# Altium footprint library LimeMicroAltiumLib_pcbLib_r01.PcbLib: 434 footprints (part 10 of 29)
Each footprint in its own frame and in the unit in brackets; x right, y up, seen from the top. Pads: shape width x height; smd on the part's side, far side on the other; paste and mask are expansions set on the pad; w line width, h text height; cw(c..) or ccw(c..) is an arc to the next point about the centre after c.
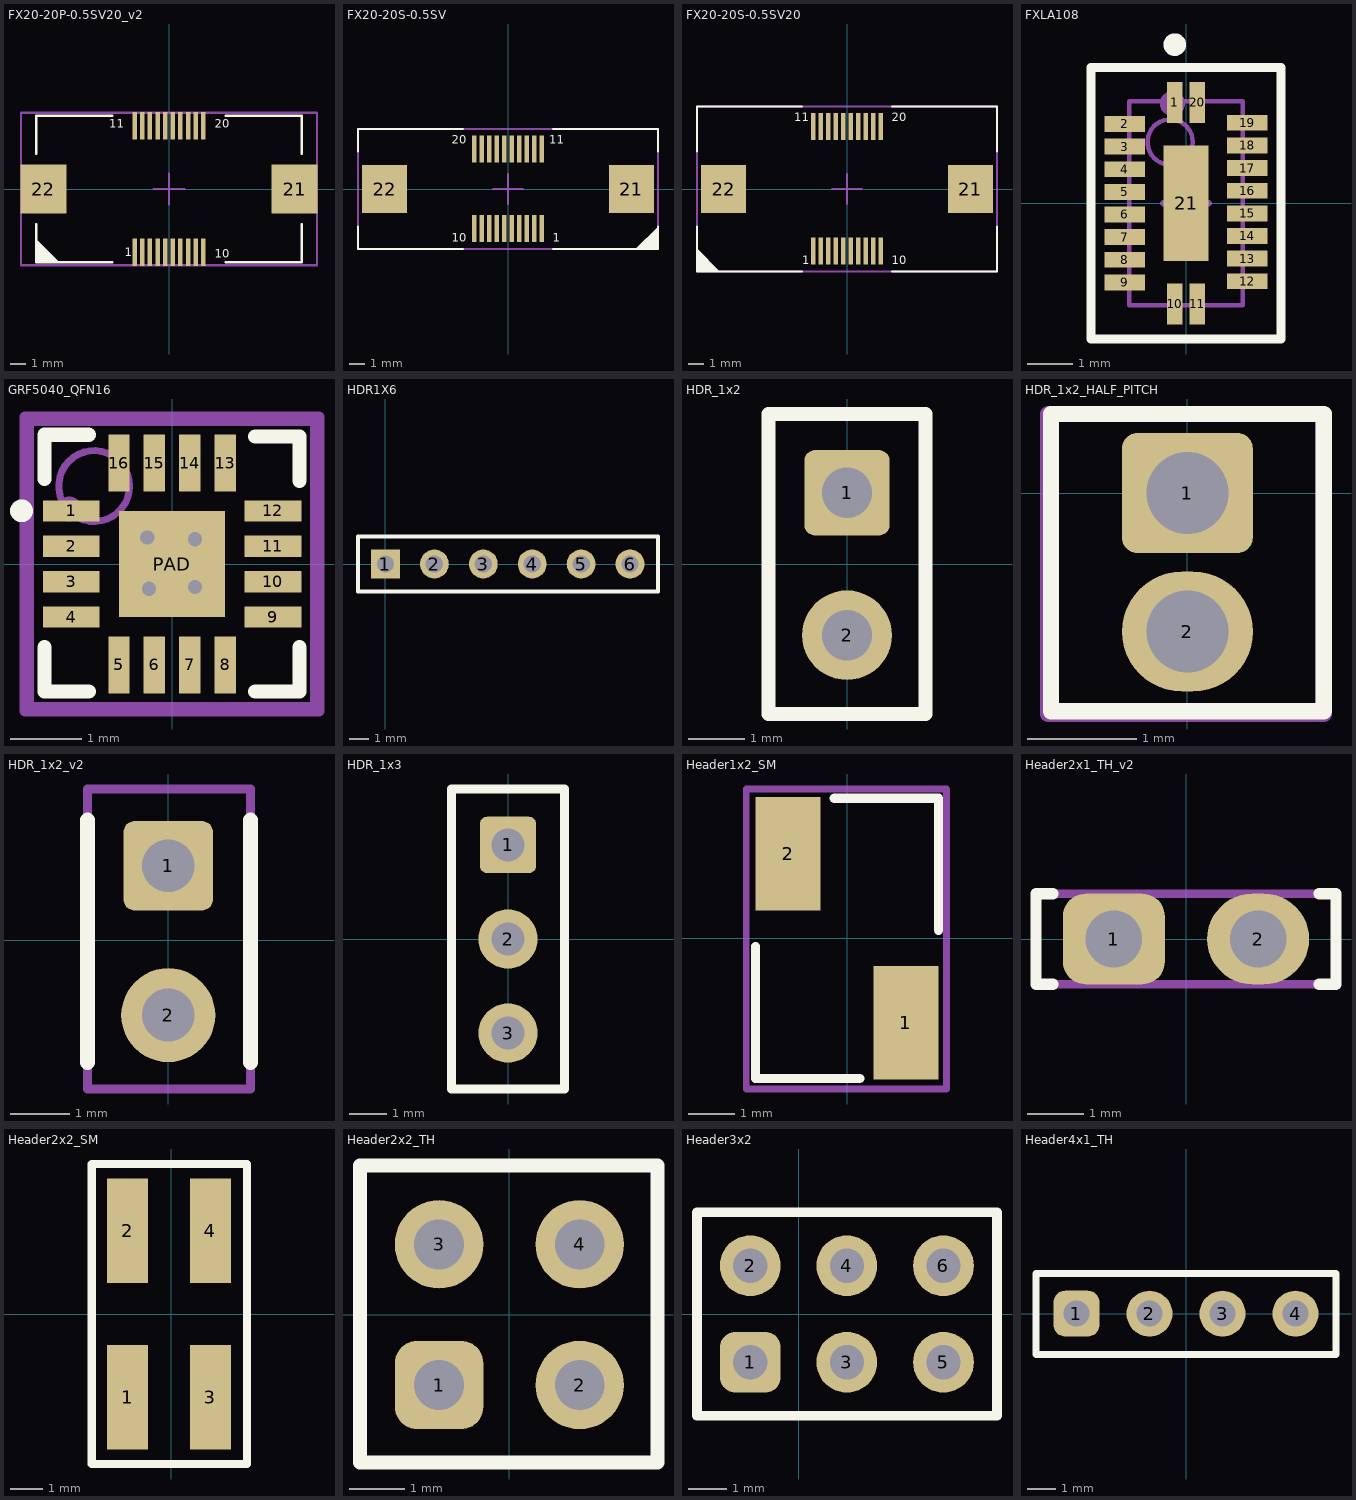
[diagram p9: the footprints below, top view; thin cyan lines are the x and y axes]

## FX20-20P-0.5SV20_v2 [mm]
pads (22):
  rect 0.3x1.8 smd mask+0.05: 1(-2.25,-4.15) 2(-1.75,-4.15) 3(-1.25,-4.15) 4(-0.75,-4.15) 5(-0.25,-4.15) 6(0.25,-4.15) 7(0.75,-4.15) 8(1.25,-4.15) 9(1.75,-4.15) 10(2.25,-4.15) 11(-2.25,4.15) 12(-1.75,4.15) 13(-1.25,4.15) 14(-0.75,4.15) 15(-0.25,4.15) 16(0.25,4.15) 17(0.75,4.15) 18(1.25,4.15) 19(1.75,4.15) 20(2.25,4.15)
  rect 3x3.2 smd mask+0.05: 21(8.23,0) 22(-8.23,0)
Top Overlay:
  region: -8.7,-3.3 -7.2,-4.8 -8.7,-4.8
  lines w0.15: -8.7,-2.3 -8.7,-4.8 -3.7,-4.8 ; -8.7,2.3 -8.7,4.8 -3.7,4.8 ; 3.7,-4.8 8.7,-4.8 8.7,-2.3 ; 3.7,4.8 8.7,4.8 8.7,2.3
  text "10" at 3,-4.5 h0.55
  text "1" at -2.9,-4.4 h0.55
  text "11" at -3.9,4 h0.55
  text "20" at 3,4 h0.55
Mechanical 15:
  lines w0.15: -1,0 1,0 ; 0,-1 0,1 ; -9.7,-5 9.7,-5 9.7,5 -9.7,5 -9.7,-5
  text "20" at 2.5,4 h0.55
  text "11" at -3,4 h0.55
  text "10" at 2.5,-4.5 h0.55
  text "1" at -2.5,-4.5 h0.55
  text ".Designator" at 0,0 h0.55
3D body "FX20-20P-0.5SV20.stp": height 18.2, standoff 0, extent -8.7,-4.75 8.7,4.75

## FX20-20S-0.5SV [mm]
pads (22):
  rect 0.3x1.8 smd mask+0.05: 1(2.25,-2.65) 2(1.75,-2.65) 3(1.25,-2.65) 4(0.75,-2.65) 5(0.25,-2.65) 6(-0.25,-2.65) 7(-0.75,-2.65) 8(-1.25,-2.65) 9(-1.75,-2.65) 10(-2.25,-2.65) 11(2.25,2.65) 12(1.75,2.65) 13(1.25,2.65) 14(0.75,2.65) 15(0.25,2.65) 16(-0.25,2.65) 17(-0.75,2.65) 18(-1.25,2.65) 19(-1.75,2.65) 20(-2.25,2.65)
  rect 3x3.2 smd mask+0.05: 21(8.23,0) 22(-8.23,0)
Top Overlay:
  region: 8.5,-4 10,-2.5 10,-4
  lines w0.15: -10,-2.5 -10,-4 -3,-4 ; -10,2.5 -10,4 -3,4 ; 3,-4 10,-4 10,-2.5 ; 3,4 10,4 10,2.5
  text "10" at -3.75,-3.5 h0.55
  text "1" at 3,-3.5 h0.55
  text "11" at 2.75,3 h0.55
  text "20" at -3.75,3 h0.55
Mechanical 15:
  lines w0.15: -1,0 1,0 ; 0,-1 0,1 ; -10,-4 10,-4 10,4 -10,4 -10,-4
  text "20" at -3.5,2.5 h0.55
  text "11" at 2.5,2.5 h0.55
  text "10" at -3,-3 h0.55
  text "1" at 2.5,-3 h0.55
  text ".Designator" at 0,0 h0.55
3D body "FX20-20S-0.5SV.stp": height 8.3, standoff 0, extent -8.7,-3.4 8.7,3.4

## FX20-20S-0.5SV20 [mm]
pads (22):
  rect 0.3x1.8 smd mask+0.05: 1(-2.25,-4.15) 2(-1.75,-4.15) 3(-1.25,-4.15) 4(-0.75,-4.15) 5(-0.25,-4.15) 6(0.25,-4.15) 7(0.75,-4.15) 8(1.25,-4.15) 9(1.75,-4.15) 10(2.25,-4.15) 11(-2.25,4.15) 12(-1.75,4.15) 13(-1.25,4.15) 14(-0.75,4.15) 15(-0.25,4.15) 16(0.25,4.15) 17(0.75,4.15) 18(1.25,4.15) 19(1.75,4.15) 20(2.25,4.15)
  rect 3x3.2 smd mask+0.05: 21(8.23,0) 22(-8.23,0)
Top Overlay:
  region: -10,-4 -8.5,-5.5 -10,-5.5
  lines w0.15: -10,-2.5 -10,-5.5 -3,-5.5 ; -10,2.5 -10,5.5 -3,5.5 ; 3,-5.5 10,-5.5 10,-2.5 ; 3,5.5 10,5.5 10,2.5
  text "20" at 3,4.5 h0.55
  text "11" at -3.5,4.5 h0.55
  text "1" at -3,-5 h0.55
  text "10" at 3,-5 h0.55
Mechanical 15:
  lines w0.15: -1,0 1,0 ; 0,-1 0,1 ; -10,-5.5 -10,5.5 10,5.5 10,-5.5 -10,-5.5
  text ".Designator" at 0,0 h0.55
  text "1" at -2.5,-4.5 h0.55
  text "10" at 2.5,-4.5 h0.55
  text "11" at -3,4 h0.55
  text "20" at 2.5,4 h0.55
3D body "FX20-20P-0.5SV20.stp": height 18.2, standoff 0, extent -8.7,-4.75 8.7,4.75

## FXLA108 [mm] "PQFN, 20-Leads, Body 2,50x4,50mm, Pitch 0,50mm, Thermal Pad 1,00x2,55mm, IPC Medium Density"
height 0.8
pads (21):
  rect 0.35x0.9 smd mask+0.05: 1(-0.25,2.225) 10(-0.25,-2.225) 11(0.25,-2.225) 20(0.25,2.225)
  rect 0.9x0.35 smd mask+0.05: 2(-1.35,1.75) 3(-1.35,1.25) 4(-1.35,0.75) 5(-1.35,0.25) 6(-1.35,-0.25) 7(-1.35,-0.75) 8(-1.35,-1.25) 9(-1.35,-1.75) 12(1.35,-1.725) 13(1.35,-1.225) 14(1.35,-0.725) 15(1.35,-0.225) 16(1.35,0.275) 17(1.35,0.775) 18(1.35,1.275) 19(1.35,1.775)
  rect 1x2.55 smd mask+0.05: 21(0,0)
Top Overlay:
  circle w0.25: c-0.25,3.5 r0.125
  lines w0.2: -2.1,-3 2.1,-3 2.1,3 -2.1,3 -2.1,-3
Top Solder:
  region: -1.85,1.975 -1.85,-1.975 -0.85,-1.975 -0.85,1.975
  region: 0.85,2 0.85,-1.95 1.85,-1.95 1.85,2
  region: -0.475,2.725 0.475,2.725 0.475,1.725 -0.475,1.725
  region: -0.475,-1.725 0.475,-1.725 0.475,-2.725 -0.475,-2.725
Mechanical 13:
  circle w0.1: c-0.35,1.35 r0.5
  lines w0.1: -1.25,-2.25 -1.25,2.25 1.25,2.25 1.25,-2.25 -1.25,-2.25
Mechanical 15:
  circle w0.35: c-0.3,2.2 r0.1
  lines w0.15: -0.5,0 0.5,0 ; 0,-0.5 0,0.5 ; -2.1,-3 -2.1,3 2.1,3 2.1,-3 -2.1,-3
  text ".Designator" at 0,0 h0.55
3D body: height 0.8, standoff 0, extent -1.25,-2.25 1.25,2.25

## GRF5040_QFN16 [mm]
pads (17):
  rect 0.8x0.3 smd mask+0.05: 1(-1.425,0.75) 2(-1.425,0.25) 3(-1.425,-0.25) 4(-1.425,-0.75) 9(1.425,-0.75) 10(1.425,-0.25) 11(1.425,0.25) 12(1.425,0.75)
  rect 0.3x0.8 smd mask+0.05: 5(-0.75,-1.425) 6(-0.25,-1.425) 7(0.25,-1.425) 8(0.75,-1.425) 13(0.75,1.425) 14(0.25,1.425) 15(-0.25,1.425) 16(-0.75,1.425)
  rect 1.5x1.5 smd mask+0.05: PAD(0,0)
via -0.325,-0.35 diameter 0.4 hole 0.2
via 0.325,-0.325 diameter 0.4 hole 0.2
via 0.325,0.35 diameter 0.4 hole 0.2
via -0.35,0.375 diameter 0.4 hole 0.2
Top Overlay:
  circle w0.25: c-2.125,0.75 r0.035
  lines w0.2: -1.8,-1.175 -1.8,-1.8 -1.175,-1.8 ; -1.8,1.2 -1.8,1.825 -1.175,1.825 ; 1.175,-1.8 1.8,-1.8 1.8,-1.175 ; 1.175,1.8 1.8,1.8 1.8,1.175
Mechanical 13:
  circle w0.1: c-1.1,1.1 r0.5
  lines w0.1: -2,-2 -2,2 2,2 2,-2 -2,-2
Mechanical 15:
  circle w0.35: c-1.45,0.775 r0
  lines w0.15: -0.5,0 0.5,0 ; 0,-0.5 0,0.5 ; -2.075,-2.075 -2.075,2.075 2.075,2.075 2.075,-2.075 -2.075,-2.075
  text ".Designator" at 0,0 h0.55
3D body "User Library-qfn16-3x3.step": height 0.92, standoff 0, extent -1.5,-1.5 1.5,1.5

## HDR1X6 [mm] "Connector; Header; 6 Position"
pads (6):
  rect 1.5x1.5 hole 0.9: 1(0,0)
  round 1.5 hole 0.9: 2(2.54,0) 3(5.08,0) 4(7.62,0) 5(10.16,0) 6(12.7,0)
Top Overlay:
  lines w0.2: -1.425,-1.425 14.15,-1.425 14.15,1.425 -1.425,1.425 -1.425,-1.425
Mechanical 15:
  lines w0.15: -1.425,-1.425 -1.425,1.425 14.15,1.425 14.15,-1.425 -1.425,-1.425
  text ".Designator" at 5.08,0 h0.55
3D body "65775.stp": height 8.54, standoff -3, extent 11.43,-1.27 13.97,1.27
3D body "65775.stp": height 8.54, standoff -3, extent 8.89,-1.27 11.43,1.27
3D body "65775.stp": height 8.54, standoff -3, extent 6.35,-1.27 8.89,1.27
3D body "65775.stp": height 8.54, standoff -3, extent 3.81,-1.27 6.35,1.27
3D body "65775.stp": height 8.54, standoff -3, extent 1.27,-1.27 3.81,1.27
3D body "65775.stp": height 8.54, standoff -3, extent -1.27,-1.27 1.27,1.27

## HDR_1x2 [mm]
pads (2):
  rrect25% 1.524x1.524 hole 0.9: 1(0,1.27)
  round 1.6 hole 0.9: 2(0,-1.27)
Top Overlay:
  lines w0.254: -1.4,-2.675 1.4,-2.675 1.4,2.675 -1.4,2.675 -1.4,-2.675
Mechanical 15:
  lines w0.15: -1.4,-2.675 1.4,-2.675 1.4,2.675 -1.4,2.675 -1.4,-2.675
  text ".Designator" at 0,0 h0.55
3D body "65775.stp": height 8.54, standoff -3, extent -1.27,-2.54 1.27,0
3D body "65775.stp": height 8.54, standoff -3, extent -1.27,0 1.27,2.54

## HDR_1x2_HALF_PITCH [mm] "1.27 pitch"
pads (2):
  rrect25% 1.2x1.1 hole 0.75 mask+0.05: 1(0,0)
  oval 1.2x1.1 hole 0.75 mask+0.05: 2(0,-1.27)
Top Overlay:
  lines w0.15: -1.25,-2 -1.25,0.725 1.25,0.725 1.25,-2 -1.25,-2
Mechanical 15:
  lines w0.15: -1.275,-2.025 -1.275,0.725 1.25,0.725 1.25,-2.025 -1.275,-2.025
  text ".Designator" at 0,-1.27 h0.55
3D body "User Library-PinHeader1_27_2.STEP": height 5, standoff -2.3, extent -1.2,-1.905 1.2,0.635

## HDR_1x2_v2 [mm]
pads (2):
  rrect25% 1.524x1.524 hole 0.9: 1(0,1.27)
  round 1.6 hole 0.9: 2(0,-1.27)
Top Overlay:
  lines w0.254: -1.375,-2.075 -1.375,2.05 ; 1.4,-2.075 1.4,2.05
Mechanical 15:
  lines w0.15: -1.375,-2.525 -1.375,2.575 1.4,2.575 1.4,-2.525 -1.375,-2.525
  text ".Designator" at 0,0 h0.55
3D body "65775.stp": height 8.54, standoff -3, extent -1.27,0 1.27,2.54
3D body "65775.stp": height 8.54, standoff -3, extent -1.27,-2.54 1.27,0

## HDR_1x3 [mm]
pads (3):
  rrect25% 1.524x1.524 hole 0.9: 1(0,2.54)
  round 1.6 hole 0.9: 2(0,0) 3(0,-2.54)
Top Overlay:
  lines w0.254: -1.525,-4.05 1.525,-4.05 1.525,4.05 -1.525,4.05 -1.525,-4.05
Mechanical 15:
  lines w0.15: -1.525,-4.05 1.525,-4.05 1.525,4.05 -1.525,4.05 -1.525,-4.05
  text ".Designator" at 0,0 h0.55
3D body "65775.stp": height 8.54, standoff -3, extent -1.27,1.27 1.27,3.81
3D body "65775.stp": height 8.54, standoff -3, extent -1.27,-1.27 1.27,1.27
3D body "65775.stp": height 8.54, standoff -3, extent -1.27,-3.81 1.27,-1.27

## Header1x2_SM [mm]
pads (2):
  rect 1.4x2.45 smd: 1(1.27,-1.825) 2(-1.27,1.825)
Top Overlay:
  lines w0.2: -1.975,-0.175 -1.975,-3.025 0.275,-3.025 ; -0.275,3.025 1.975,3.025 1.975,0.175
Mechanical 15:
  lines w0.15: -2.175,-3.25 2.15,-3.25 2.15,3.225 -2.175,3.225 -2.175,-3.25
  text ".Designator" at -0.05,0.175 h0.55

## Header2x1_TH_v2 [mm]
pads (2):
  rrect50% 1.8x1.6 hole 1: 1(-1.271,0)
  oval 1.8x1.6 hole 1: 2(1.271,0)
Top Overlay:
  lines w0.2: -2.343,-0.8 -2.643,-0.8 -2.643,0.8 -2.343,0.8 ; 2.343,-0.8 2.643,-0.8 2.643,0.8 2.343,0.8
Mechanical 15:
  lines w0.15: -2.643,-0.8 2.643,-0.8 2.643,0.8 -2.643,0.8 -2.643,-0.8
  text ".Designator" at 0.014,0 h0.55

## Header2x2_SM [mm]
pads (4):
  rect 1.27x3.2 smd: 1(-1.336,-2.55) 2(-1.336,2.55) 3(1.207,-2.55) 4(1.207,2.55)
Top Overlay:
  lines w0.254: -2.436,-4.6 -2.436,4.6 2.325,4.6 2.325,-4.6 -2.436,-4.6
Mechanical 15:
  lines w0.15: -2.425,-4.6 -2.425,4.575 2.325,4.575 2.325,-4.6 -2.425,-4.6
  text ".Designator" at -1.4,-0.1 h0.55
3D body "pin_header_a-sl254-dg-g04mp1.stp": height 9.7, standoff -0.04, extent -2.54,-3.7 2.54,3.8

## Header2x2_TH [mm]
pads (4):
  rrect50% 1.6x1.6 hole 0.9: 1(-1.271,-1.271)
  round 1.6 hole 0.9: 2(1.271,-1.271) 3(-1.271,1.271) 4(1.271,1.271)
Top Overlay:
  lines w0.254: -2.7,-2.675 -2.7,2.7 2.675,2.7 2.675,-2.675 -2.7,-2.675
Mechanical 15:
  lines w0.15: -2.725,-2.7 2.675,-2.7 2.675,2.725 -2.725,2.725 -2.725,-2.7
  text ".Designator" at 0,0 h0.55
3D body "65775.stp": height 8.54, standoff -3, extent -2.541,0.002 -0.001,2.542
3D body "65775.stp": height 8.54, standoff -3, extent 0.001,0.002 2.541,2.542
3D body "65775.stp": height 8.54, standoff -3, extent -2.541,-2.541 -0.001,-0.001
3D body "65775.stp": height 8.54, standoff -3, extent 0.001,-2.541 2.541,-0.001

## Header3x2 [mm]
pads (6):
  rrect50% 1.6x1.6 hole 0.9: 1(-1.271,-1.271)
  round 1.6 hole 0.9: 2(-1.271,1.271) 3(1.271,-1.271) 4(1.271,1.271) 5(3.814,-1.271) 6(3.814,1.271)
Top Overlay:
  lines w0.254: -2.675,-2.675 5.225,-2.675 5.225,2.675 -2.675,2.675 -2.675,-2.675
Mechanical 15:
  lines w0.15: -2.675,-2.675 -2.675,2.675 5.225,2.675 5.225,-2.675 -2.675,-2.675
  text ".Designator" at 0,0 h0.55
3D body "65775.stp": height 8.54, standoff -3, extent -2.541,-2.541 -0.001,-0.001
3D body "65775.stp": height 8.54, standoff -3, extent 0.001,-2.541 2.541,-0.001
3D body "65775.stp": height 8.54, standoff -3, extent 2.544,-2.541 5.084,-0.001
3D body "65775.stp": height 8.54, standoff -3, extent 2.544,0.002 5.084,2.542
3D body "65775.stp": height 8.54, standoff -3, extent 0.001,0.002 2.541,2.542
3D body "65775.stp": height 8.54, standoff -3, extent -2.541,0.002 -0.001,2.542

## Header4x1_TH [mm]
pads (4):
  rrect50% 1.6x1.6 hole 0.9: 1(-3.814,0)
  round 1.6 hole 0.9: 2(-1.271,0) 3(1.271,0) 4(3.814,0)
Top Overlay:
  lines w0.254: -5.225,-1.425 5.225,-1.425 5.225,1.4 -5.225,1.4 -5.225,-1.425
Mechanical 15:
  lines w0.15: -5.225,-1.425 -5.225,1.4 5.225,1.4 5.225,-1.425 -5.225,-1.425
  text ".Designator" at -0.129,0 h0.55
3D body "65775.stp": height 8.54, standoff -3, extent 2.544,-1.27 5.084,1.27
3D body "65775.stp": height 8.54, standoff -3, extent 0.001,-1.27 2.541,1.27
3D body "65775.stp": height 8.54, standoff -3, extent -2.541,-1.27 -0.001,1.27
3D body "65775.stp": height 8.54, standoff -3, extent -5.084,-1.27 -2.544,1.27